# Altium footprint library cool_library.PcbLib: 1182 footprints (part 75 of 75)
Each footprint in its own frame and in the unit in brackets; x right, y up, seen from the top. Pads: shape width x height; smd on the part's side, far side on the other; paste and mask are expansions set on the pad; w line width, h text height; cw(c..) or ccw(c..) is an arc to the next point about the centre after c.
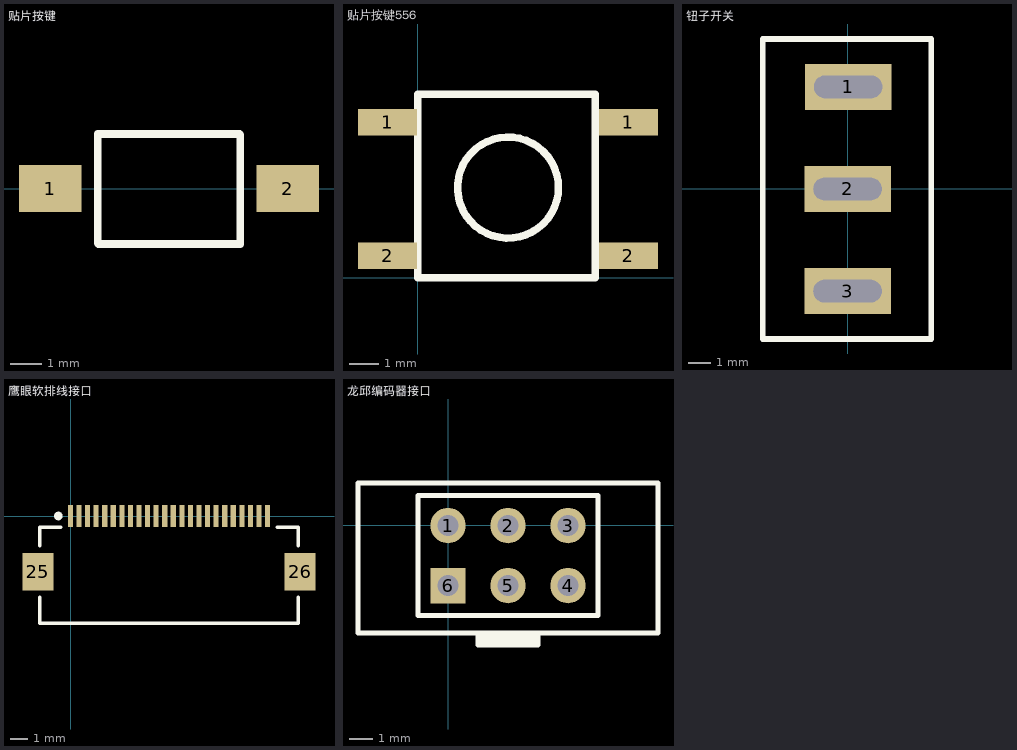
[diagram p74: the footprints below, top view; thin cyan lines are the x and y axes]

## 贴片按键 [mm]
pads (2):
  rect 2x1.5 smd: 1(4.445,0) 2(12.065,0)
Top Overlay:
  lines w0.254: 5.969,-1.75 5.969,0 5.969,1.75 10.513,1.75 10.541,1.722 10.541,-1.778 5.997,-1.778 5.969,-1.75

## 贴片按键556 [mm]
pads (4):
  rect 2x0.9 smd: 1(-1.016,5.25) 1(7.112,5.25) 2(-1.016,0.75) 2(7.112,0.75)
Top Overlay:
  circle w0.254: c3.048,3.048 r1.704
  lines w0.254: 0,0 0,6.2 6,6.2 6,0 0,0

## 钮子开关 [mil]
pads (3):
  rect 150x80 hole 39.37 slot 118.11 at 0 deg: 1(1,177) 2(0,0) 3(0,-177)
Top Overlay:
  lines w10: -146.84,-260 -146.84,260 145,260 145,-260 -146.84,-260

## 鹰眼软排线接口 [mm]
pads (26):
  rect 0.3x1.295 smd: 1(-0.021,0.019) 2(0.479,0.019) 3(0.979,0.019) 4(1.479,0.019) 5(1.979,0.019) 6(2.479,0.019) 7(2.979,0.019) 8(3.479,0.019) 9(3.979,0.019) 10(4.479,0.019) 11(4.979,0.019) 12(5.479,0.019) 13(5.979,0.019) 14(6.479,0.019) 15(6.979,0.019) 16(7.479,0.019) 17(7.979,0.019) 18(8.479,0.019) 19(8.979,0.019) 20(9.479,0.019) 21(9.979,0.019) 22(10.479,0.019) 23(10.979,0.019) 24(11.479,0.019)
  rect 1.8x2.2 smd: 25(-1.921,-3.231) 26(13.379,-3.231)
Top Overlay:
  circle w0.25: c-0.721,0.019 r0.125
  lines w0.2: -1.821,-4.731 -1.821,-6.231 13.279,-6.231 13.279,-4.731 ; -1.821,-1.731 -1.821,-0.631 -0.571,-0.631 ; 12.029,-0.631 13.279,-0.631 13.279,-1.731

## 龙邱编码器接口 [mm]
pads (6):
  round 1.5 hole 0.9: 1(0,-0.025) 2(2.54,-0.025) 3(5.08,-0.025) 4(5.08,-2.565) 5(2.54,-2.565)
  rect 1.5x1.5 hole 0.9: 6(0,-2.565)
Top Overlay:
  lines w0.2: -1.27,-3.835 6.35,-3.835 6.35,-1.295 6.35,1.245 -1.27,1.245 -1.27,-1.295 -1.27,-3.835
  lines w0.203: 3.81,-4.953 1.27,-4.953 1.27,-4.826 ; 1.27,-4.826 1.27,-5.08 3.81,-5.08 3.81,-4.826 ; 1.27,-4.826 1.27,-4.699 3.81,-4.699 3.81,-4.826 ; 1.27,-4.826 3.81,-4.826 ; -3.81,-4.572 -3.81,1.778 8.89,1.778 8.89,-4.572 -3.81,-4.572
3D body: height 10.1, standoff -1.5, extent -1.27,-3.835 6.35,-1.295
3D body: height 10.1, standoff -1.5, extent -1.296,-1.296 6.324,1.244